# Altium footprint library ZabugorLib.PcbLib: 42 footprints (part 1 of 3)
Each footprint in its own frame and in the unit in brackets; x right, y up, seen from the top. Pads: shape width x height; smd on the part's side, far side on the other; paste and mask are expansions set on the pad; w line width, h text height; cw(c..) or ccw(c..) is an arc to the next point about the centre after c.
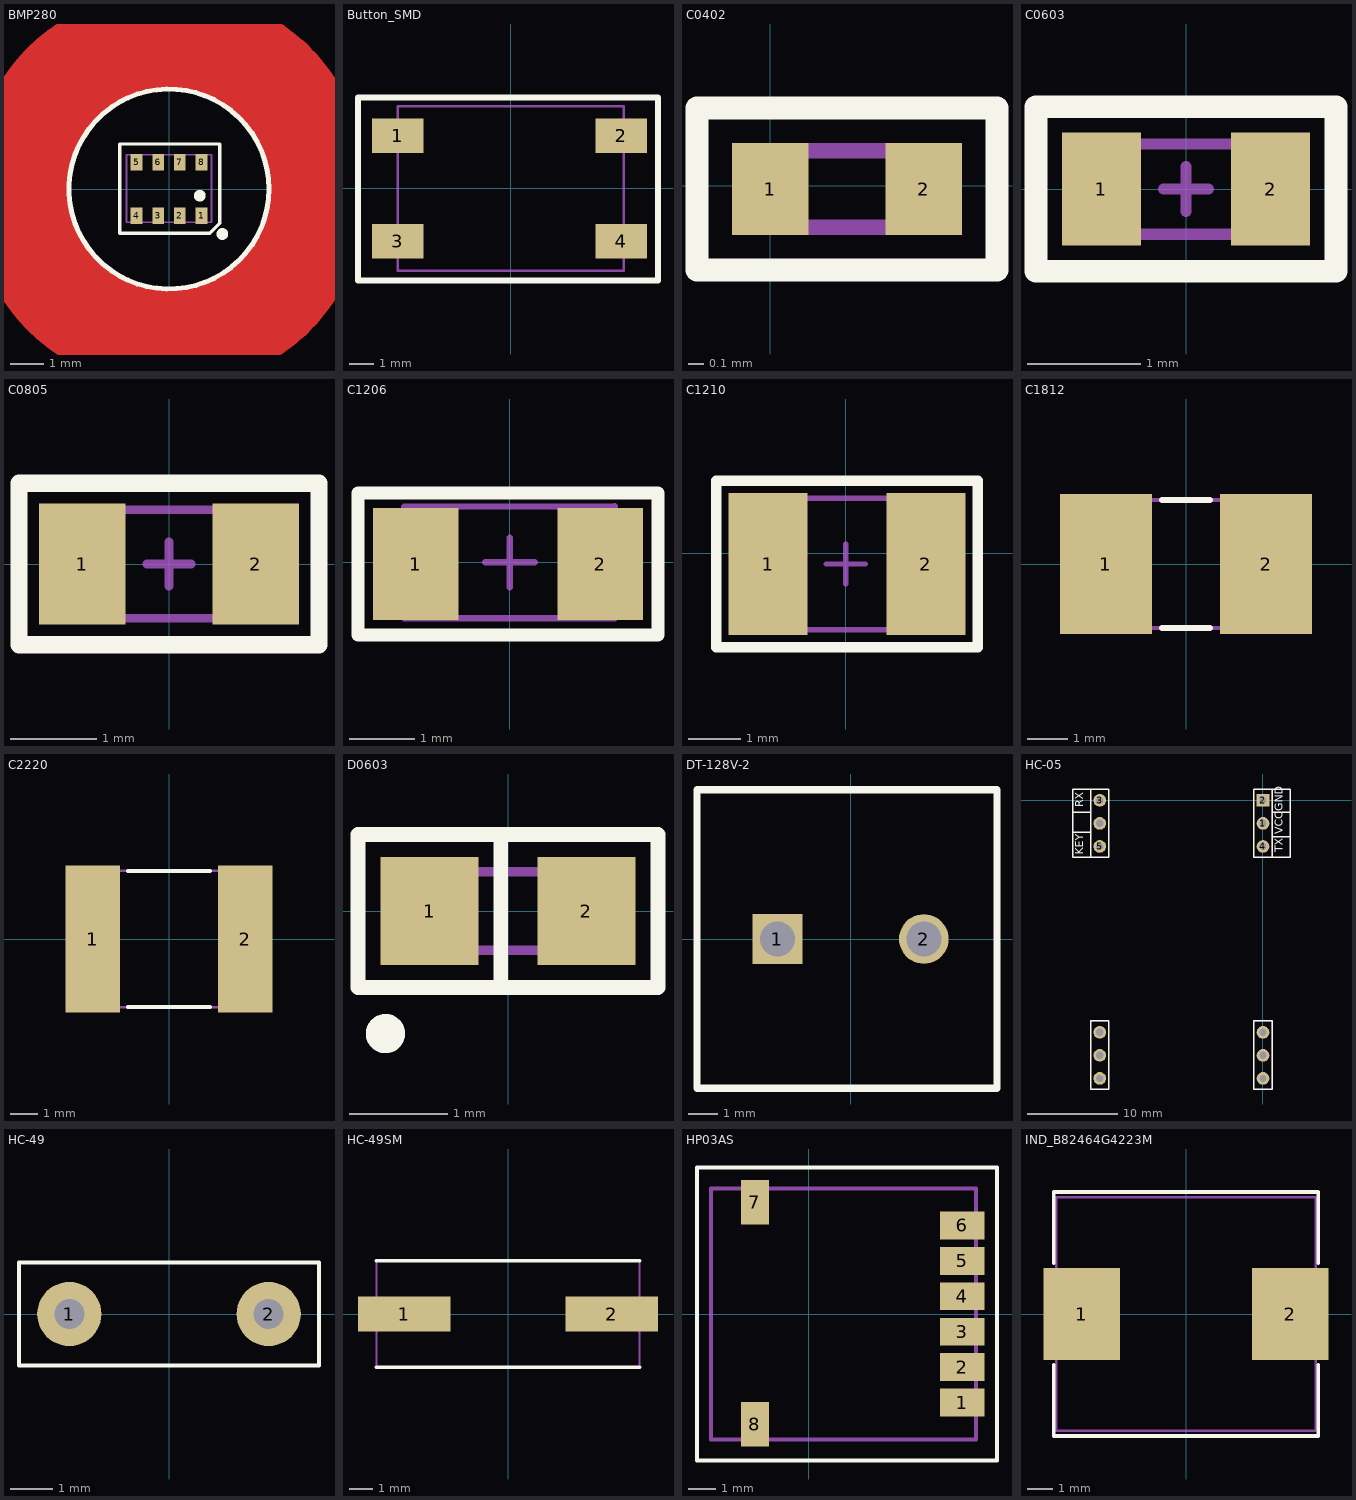
[diagram p0: the footprints below, top view; thin cyan lines are the x and y axes]

## BMP280 [mm]
pads (8):
  rect 0.35x0.5 smd: 1(0.975,-0.8) 2(0.325,-0.8) 3(-0.325,-0.8) 4(-0.975,-0.8) 5(-0.975,0.8) 6(-0.325,0.8) 7(0.325,0.8) 8(0.975,0.8)
Top Layer:
  circle w3: c0,0 r4.5
Top Overlay:
  circle w0.15: c0,0 r3
  circle w0.254: c1.6,-1.35 r0.05
  circle w0.254: c0.925,-0.2 r0.05
  lines w0.1: -1.475,-1.325 -1.475,1.35 1.525,1.35 1.525,-1.025 1.225,-1.325 -1.475,-1.325
Top Solder:
  circle w3.3: c0,0 r4.45
Mechanical 15:
  lines w0.05: -1.275,-1 1.275,-1 1.275,1.025 -1.275,1.025 -1.275,-1
3D body "User Library-BST-BMP280.step": height 1, standoff 0, extent -1.25,-1 1.25,1

## Button_SMD [mm] "Кнопка"
pads (4):
  rect 2.1x1.4 smd: 1(-4.6,2.15) 2(4.5,2.15) 3(-4.6,-2.15) 4(4.5,-2.15)
Top Overlay:
  lines w0.254: -6.225,3.7 -6.225,-3.75 -3.175,-3.75 2.925,-3.75 6,-3.75 6,3.675 ; -6.2,3.7 -3,3.7 2.8,3.7 3.863,3.7 5.088,3.7 6,3.7
Mechanical 7:
  lines w0.1: -4.6,-3.35 4.6,-3.35 4.6,3.35 -4.6,3.35 -4.6,-3.35
3D body "User Library-PTS645SL70SMTR92-LFS.STEP": height 7, standoff 0, extent -4.5,-3 4.5,3

## C0402 [mm]
pads (2):
  rect 0.5x0.6 smd: 1(0,-0.02) 2(1,-0.02)
Top Overlay:
  lines w0.15: -0.48,-0.55 1.48,-0.55 1.48,0.51 -0.48,0.51 -0.48,-0.55
Mechanical 7:
  lines w0.1: 0,-0.27 0,0.23 1,0.23 1,-0.27 0,-0.27
Mechanical 10:
  text ".Comment" at -0.08,-1.13 h0.6
  text ".Designator" at -0.08,0.73 h0.8
3D body "User Library-C0402-1.step": height 0.48, standoff -0.01, extent 0.01,-0.254 1.006,0.246

## C0603 [mm]
height 0.9
pads (2):
  rect 0.7x1 smd: 1(-0.75,0) 2(0.75,0)
Top Overlay:
  lines w0.2: -1.33,-0.73 -1.33,0.73 1.33,0.73 1.33,-0.73 -1.33,-0.73
Mechanical 9:
  text ".Comment" at -0.75,-0.5 h0.8
  text ".Designator" at -0.75,0 h1
Mechanical 11:
  lines w0.1: -0.8,-0.4 0.8,-0.4 0.8,0.4 -0.8,0.4 -0.8,-0.4
Mechanical 15:
  lines w0.05: 0,0.725 -1.325,0.725 ; -1.325,0.725 -1.325,-0.725 1.325,-0.725 1.325,0.725 -1.325,0.725
  lines w0.1: -0.2,0 0.2,0 ; 0,-0.2 0,0.2
3D body "CAPC0603.STEP": height 0.9, standoff 0, extent -0.8,-0.4 0.8,0.4

## C0805 [mm]
height 1.3
pads (2):
  rect 1x1.4 smd: 1(-1,0) 2(1,0)
Top Overlay:
  lines w0.2: -1.73,-0.93 -1.73,0.93 1.73,0.93 1.73,-0.93 -1.73,-0.93
Mechanical 9:
  text ".Comment" at -0.75,-0.5 h0.8
  text ".Designator" at -0.75,0.25 h1
Mechanical 11:
  lines w0.1: -1,-0.625 1,-0.625 1,0.625 -1,0.625 -1,-0.625
Mechanical 15:
  lines w0.05: -1.73,-0.93 1.73,-0.93 1.73,0.93 -1.73,0.93 -1.73,-0.93
  lines w0.1: -0.254,0 0.254,0 ; 0,-0.254 0,0.254
3D body "CAP0805.STEP": height 0.78, standoff 0, extent -1,-0.625 1,0.625

## C1206 [mm]
height 1.5
pads (2):
  rect 1.3x1.7 smd: 1(-1.428,-0.024) 2(1.372,-0.024)
Top Overlay:
  lines w0.2: -2.308,-1.104 -2.308,1.056 2.252,1.056 2.252,-1.104 -2.308,-1.104
Mechanical 9:
  text ".Designator" at -1,0.25 h1
  text ".Comment" at -1,-0.5 h0.8
Mechanical 11:
  lines w0.1: -1.603,-0.849 1.597,-0.849 1.597,0.851 -1.603,0.849 -1.603,-0.849
Mechanical 15:
  lines w0.05: 0,1.05 -2.3,1.05 ; -2.3,1.05 2.25,1.05 2.25,-1.1 -2.3,-1.1 -2.3,1.05
  lines w0.1: -0.375,0 0.375,0 ; 0,-0.375 0,0.375
3D body "SMD_1206.step": height 1.75, standoff 0.25, extent -1.603,-0.849 1.597,0.851

## C1210 [mm]
height 2.5
pads (2):
  rect 1.5x2.7 smd: 1(-1.475,-0.2) 2(1.525,-0.2)
Top Overlay:
  lines w0.2: -2.455,-1.78 -2.455,1.38 2.505,1.38 2.505,-1.78 -2.455,-1.78
Mechanical 9:
  text ".Comment" at -1.25,-0.75 h0.8
  text ".Designator" at -1.25,0 h1
Mechanical 11:
  lines w0.1: -1.575,-1.45 1.625,-1.45 1.625,1.05 -1.575,1.05 -1.575,-1.45
Mechanical 15:
  lines w0.05: -2.455,-1.78 2.505,-1.78 2.505,1.38 -2.455,1.38 -2.455,-1.78
  lines w0.1: -0.375,-0.2 0.375,-0.2 ; 0,-0.575 0,0.175
3D body "SMD_1210.step": height 1.65, standoff -0.05, extent -1.5,-1.425 1.7,1.075

## C1812 [mm]
height 1.7
pads (2):
  rect 2.3x3.5 smd: 1(-2,0) 2(2,0)
Top Overlay:
  lines w0.15: -0.6,-1.6 0.6,-1.6 ; -0.6,1.6 0.6,1.6
Mechanical 7:
  lines w0.1: -2.25,-1.6 -2.25,1.6 2.25,1.6 2.25,-1.6 -2.25,-1.6
Mechanical 10:
  text ".Comment" at -0.63,-2.52 h0.6
  text ".Designator" at -0.62,2.14 h0.8
3D body "User Library-CAPC4532X13.step": height 1.3, standoff 0, extent -2.25,-1.6 2.25,1.6

## C2220 [mm]
height 1.8
pads (2):
  rect 2x5.4 smd: 1(-2.8,0) 2(2.8,0)
Top Overlay:
  lines w0.15: -1.5,-2.5 1.5,-2.5 ; -1.5,2.5 1.5,2.5
Mechanical 7:
  lines w0.1: -2.8,-2.5 -2.8,2.5 2.8,2.5 2.8,-2.5 -2.8,-2.5
Mechanical 10:
  text ".Designator" at -0.56,3.04 h0.8
  text ".Comment" at -0.47,-3.45 h0.6
3D body "User Library-CAPC5750X23.step": height 2.3, standoff 0, extent -2.85,-2.5 2.85,2.5

## D0603 [mm]
height 1.1
pads (2):
  rect 1x1.1 smd: 1(-0.8,0) 2(0.8,0)
Top Overlay:
  circle w0.2: c-1.25,-1.25 r0.1
  lines w0.15: -0.075,-0.78 -0.075,0.78 ; -1.53,-0.78 1.53,-0.78 1.53,0.78 -1.53,0.78 -1.53,-0.78
Mechanical 9:
  text ".Comment" at -0.61,-1.33 h0.6
  text ".Designator" at -0.62,1 h0.8
Mechanical 11:
  lines w0.1: -0.7,-0.4 -0.7,0.4 ; -0.6,-0.4 -0.6,0.4 ; -0.5,-0.4 -0.5,0.4 ; -0.8,-0.4 -0.8,0.4 0.8,0.4 0.8,-0.4 -0.8,-0.4
3D body "User Library-LED_0603_R.STEP": height 0.6, standoff 0, extent -0.8,-0.4 0.8,0.4

## DT-128V-2 [mm]
pads (2):
  rect 1.7x1.7 hole 1.2: 1(-2.5,0)
  round 1.7 hole 1.2: 2(2.5,0)
Top Overlay:
  lines w0.254: -5.25,-5.1 -5.25,5.1 5,5.1 5,-5.1 -5.25,-5.1
3D body "User Library-DG128-5_0-02P-14.step": height 14.3, standoff -3.5, extent -5.3,-5.094 5,5.106

## HC-05 [mm]
height 0.05
pads (12):
  round 1.4 hole 0.8: 1(0,-2.54) 3(-18,0) 4(0,-5.08) 5(-18,-5.08) ""(-18,-30.66) ""(-18,-28.12) ""(-18,-25.58) ""(-18,-2.54) ""(0,-30.66) ""(0,-28.12) ""(0,-25.58)
  rect 1.4x1.4 hole 0.8: 2(0,0)
Top Overlay:
  lines w0.15: -21,-4 -21,-1.25 -21,1.25 -19,1.25 ; -21,-1.325 -19,-1.325 ; -19,-3.5 -21,-3.5 -21,-6.25 -19,-6.25 ; 1,-4 3,-4 ; 1,-1.325 3,-1.325 ; -19,-6.25 -19,1.25 ; -19,-6.25 -17,-6.25 -17,1.25 -19,1.25 ; 1,-6.25 3,-6.25 3,-4 ; 1,-6.25 -1,-6.25 -1,1.25 1,1.25 ; 1,-6.25 1,1.25 ; 1,1.25 3,1.25 3,-1.25 3,-4 ; -19,-31.83 -17,-31.83 -17,-24.33 -19,-24.33 -19,-31.83 ; -1,-31.83 1,-31.83 1,-24.33 -1,-24.33 -1,-31.83
  text "RX" at -19.5,-0.75 h1.52
  text "KEY" at -19.5,-6 h1.52
  text "TX" at 2.5,-5.75 h1.52
  text "GND" at 2.5,-1.2 h1.52
  text "VCC" at 2.5,-3.75 h1.52
Mechanical 7:
  lines w0.1: -19,-31.83 -17,-31.83 -17,-24.33 -19,-24.33 -19,-31.83 ; -19,-6.25 -19,1.25 -17,1.25 -17,-6.25 -19,-6.25 ; -1,-31.83 1,-31.83 1,-24.33 -1,-24.33 -1,-31.83 ; -1,-6.25 1,-6.25 1,1.25 -1,1.25 -1,-6.25
Mechanical 10:
  text ".Designator" at 4,-0.25 h0.8
  text ".Comment" at 4,-0.75 h0.6
3D body "HC-05_Troyka.STEP": height 5.67, standoff -6, extent -21.475,-40.675 3.525,9.325

## HC-49 [mm] "Кварцевый резонатор"
pads (2):
  round 1.5 hole 0.7: 1(-2.325,0) 2(2.325,0)
Top Overlay:
  lines w0.1: -3.5,-1.2 -3.5,1.2 3.5,1.2 3.5,-1.2 -1.3,-1.2 -3.5,-1.2
3D body "User Library-HC49_Crystal.step": height 3.6, standoff -12.7, extent -5.675,-2.325 5.675,2.325

## HC-49SM [mm] "Кварцевый резонатор поверхностного монтажа"
pads (2):
  rect 4x1.5 smd: 1(-4.5,0) 2(4.5,0)
Top Overlay:
  lines w0.15: -5.7,-2.3 5.7,-2.3 ; -5.7,2.3 5.7,2.3
Mechanical 7:
  lines w0.1: -5.7,-2.3 -5.7,2.3 5.7,2.3 5.7,-2.3 -5.7,-2.3
3D body "User Library-HC49_Crystal_SM.step": height 4.5, standoff -0.01, extent -6.95,-2.5 6.95,2.5

## HP03AS [mm] "Integrated pressure sensor"
pads (8):
  rect 1.6x1 smd: 1(5.5,-3.175) 2(5.5,-1.905) 3(5.5,-0.635) 4(5.5,0.635) 5(5.5,1.905) 6(5.5,3.175)
  rect 1x1.6 smd: 7(-1.925,4) 8(-1.925,-3.95)
Top Overlay:
  lines w0.15: -4,-5.25 -4,5.25 6.75,5.25 6.75,-5.25 -4,-5.25
Mechanical 7:
  lines w0.15: -3.5,-4.5 6,-4.5 6,4.5 -3.5,4.5 -3.5,-4.5
3D body "HP03SA.STEP": height 4.6, standoff -0.04, extent -3.525,-4.475 6.015,4.525

## IND_B82464G4223M [mm] "22 мкГн, 2.25 А, 10х10, Катушка индуктивности SMD"
pads (2):
  rect 3x3.6 smd: 1(-4.1,0) 2(4.1,0)
Top Overlay:
  lines w0.15: -5.2,-2 -5.2,-4.8 5.2,-4.8 5.2,-2 ; -5.2,2 -5.2,4.8 5.2,4.8 5.2,2
Mechanical 7:
  lines w0.1: -5.1,-4.6 -5.1,4.6 5.1,4.6 5.1,-4.6 -5.1,-4.6
Mechanical 10:
  text ".Comment" at -1.1,-6.1 h0.6
  text ".Designator" at -1.5,5.5 h0.8
3D body "User Library-10x10 SMT Power Inductor.step": height 4.8, standoff 0, extent -5.2,-5.2 5.2,5.2